# Altium footprint library PCB_GENERAL.PcbLib: 226 footprints (part 8 of 15)
Each footprint in its own frame and in the unit in brackets; x right, y up, seen from the top. Pads: shape width x height; smd on the part's side, far side on the other; paste and mask are expansions set on the pad; w line width, h text height; cw(c..) or ccw(c..) is an arc to the next point about the centre after c.
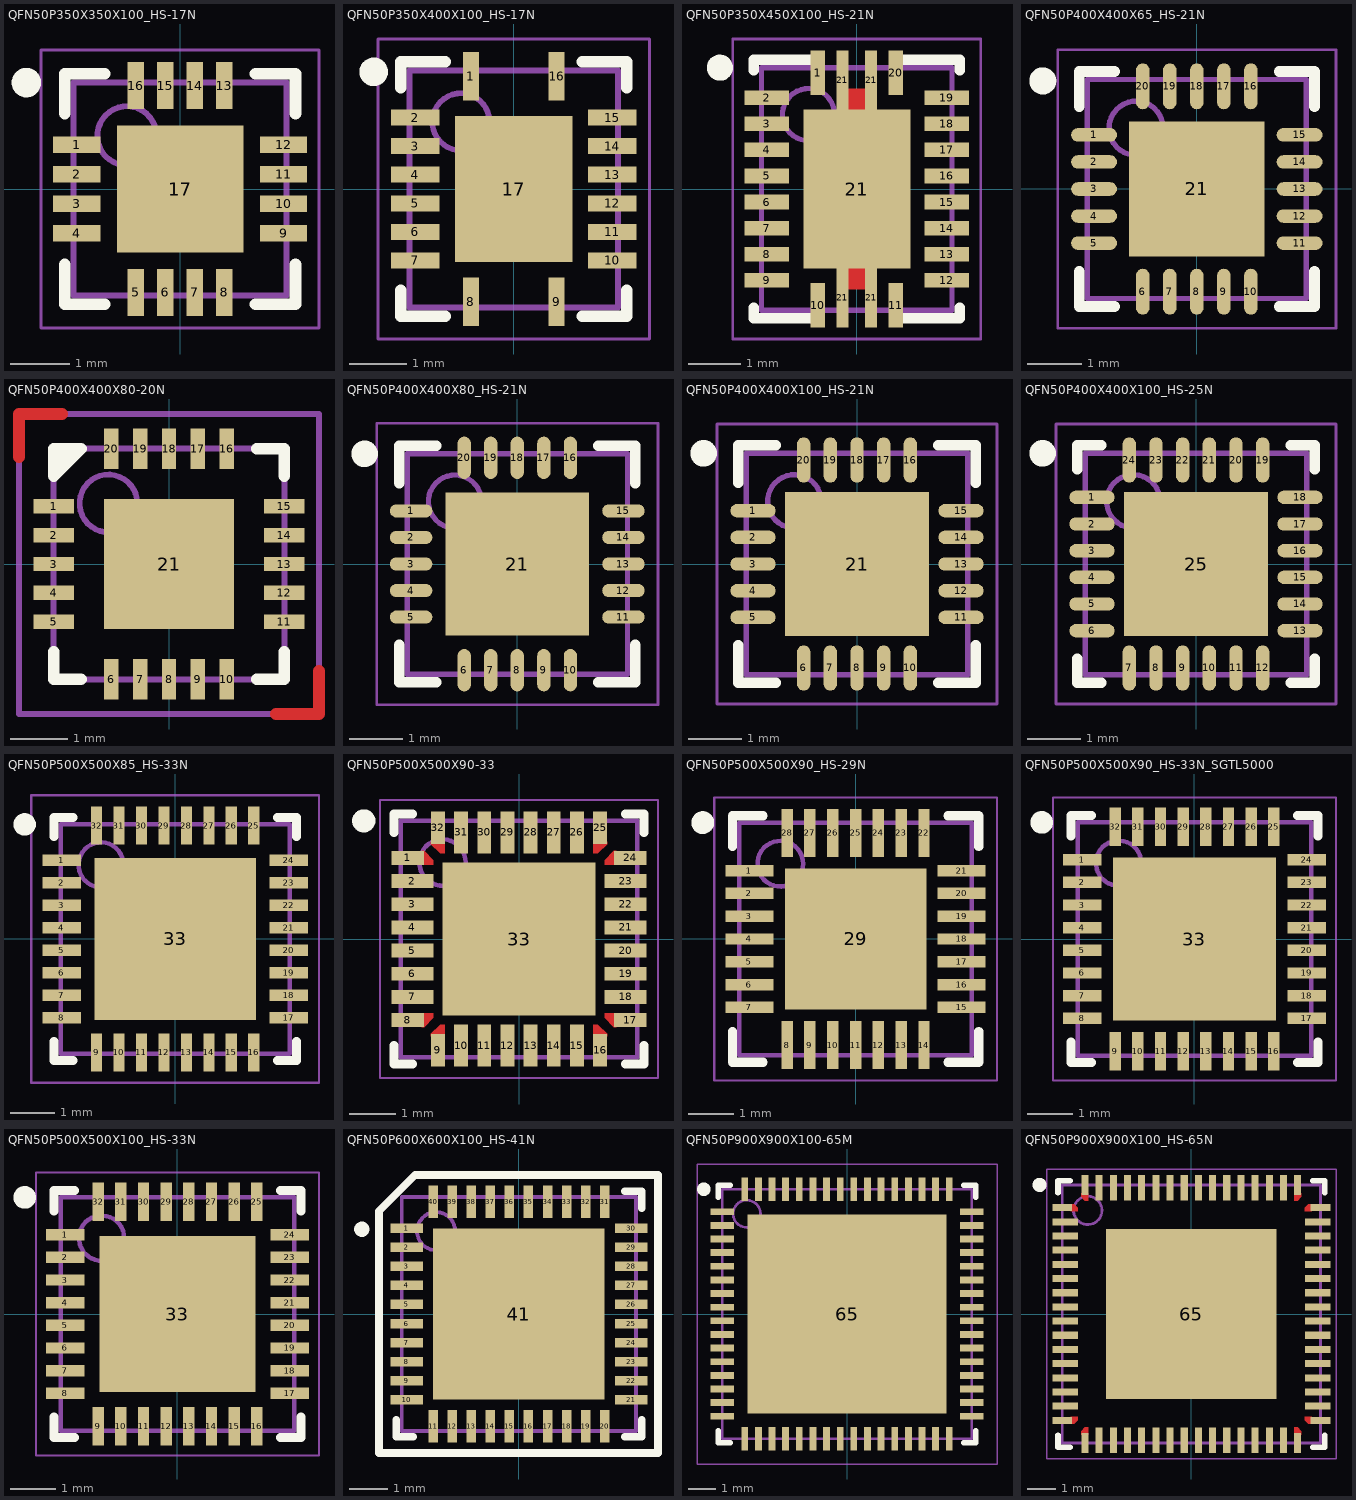
[diagram p7: the footprints below, top view; thin cyan lines are the x and y axes]

## QFN50P350X350X100_HS-17N [mm] "QFN, 16-Leads, Body 3,50x3,50mm, Pitch 0,50mm, Thermal Pad 2,14x2,14mm, IPC Medium Density"
height 1
pads (17):
  rect 0.8x0.28 smd: 1(-1.75,0.75) 2(-1.75,0.25) 3(-1.75,-0.25) 4(-1.75,-0.75) 9(1.75,-0.75) 10(1.75,-0.25) 11(1.75,0.25) 12(1.75,0.75)
  rect 0.28x0.8 smd: 5(-0.75,-1.75) 6(-0.25,-1.75) 7(0.25,-1.75) 8(0.75,-1.75) 13(0.75,1.75) 14(0.25,1.75) 15(-0.25,1.75) 16(-0.75,1.75)
  rect 2.14x2.14 smd: 17(0,0)
Top Overlay:
  circle w0.25: c-2.6,1.8 r0.125
  lines w0.2: -1.95,-1.275 -1.95,-1.95 -1.275,-1.95 ; -1.95,1.275 -1.95,1.95 -1.275,1.95 ; 1.275,-1.95 1.95,-1.95 1.95,-1.275 ; 1.275,1.95 1.95,1.95 1.95,1.275
Mechanical 11:
  text ".Designator" at -0.925,-0.325 h1
Mechanical 14:
  circle w0.1: c-0.9,0.9 r0.5
  lines w0.1: -1.8,-1.8 1.8,-1.8 1.8,1.8 -1.8,1.8 -1.8,-1.8
Mechanical 15:
  lines w0.05: -2.35,-2.35 2.35,-2.35 2.35,2.35 -2.35,2.35 -2.35,-2.35
  lines w0.1: -0.5,0 0.5,0 ; 0,-0.5 0,0.5
3D body "QFN50P350X350X100_HS-17N.step": height 1, standoff 0, extent -1.801,-1.801 1.801,1.801

## QFN50P350X400X100_HS-17N [mm] "QFN, 16-Leads, Body 3,50x4,00mm, Pitch 0,50mm, Thermal Pad 2,05x2,55mm, IPC Medium Density"
height 1
pads (17):
  rect 0.28x0.85 smd: 1(-0.75,1.975) 8(-0.75,-1.975) 9(0.75,-1.975) 16(0.75,1.975)
  rect 0.85x0.28 smd: 2(-1.725,1.25) 3(-1.725,0.75) 4(-1.725,0.25) 5(-1.725,-0.25) 6(-1.725,-0.75) 7(-1.725,-1.25) 10(1.725,-1.25) 11(1.725,-0.75) 12(1.725,-0.25) 13(1.725,0.25) 14(1.725,0.75) 15(1.725,1.25)
  rect 2.05x2.55 smd: 17(0,0)
Top Overlay:
  circle w0.25: c-2.45,2.05 r0.125
  lines w0.2: -1.975,-1.775 -1.975,-2.225 -1.2,-2.225 ; -1.975,1.775 -1.975,2.225 -1.2,2.225 ; 1.2,-2.225 1.975,-2.225 1.975,-1.775 ; 1.2,2.225 1.975,2.225 1.975,1.775
Mechanical 11:
  text ".Designator" at 0.525,-0.725 h1
Mechanical 14:
  circle w0.1: c-0.925,1.175 r0.5
  lines w0.1: -1.825,-2.075 -1.825,2.075 1.825,2.075 1.825,-2.075 -1.825,-2.075
Mechanical 15:
  lines w0.05: -2.375,-2.625 -2.375,2.625 2.375,2.625 2.375,-2.625 -2.375,-2.625
  lines w0.1: -0.5,0 0.5,0 ; 0,-0.5 0,0.5
3D body "QFN50P350X400X100_HS-17N.step": height 1, standoff 0, extent -1.826,-2.076 1.826,2.076

## QFN50P350X450X100_HS-21N [mm] "QFN, 20-Leads, Body 3,50x4,50mm, Pitch 0,50mm, Thermal Pad 2,05x3,05mm, IPC Medium Density"
height 1
pads (25):
  rect 0.28x0.85 smd: 1(-0.75,2.225) 10(-0.75,-2.225) 11(0.75,-2.225) 20(0.75,2.225)
  rect 0.85x0.28 smd: 2(-1.725,1.75) 3(-1.725,1.25) 4(-1.725,0.75) 5(-1.725,0.25) 6(-1.725,-0.25) 7(-1.725,-0.75) 8(-1.725,-1.25) 9(-1.725,-1.75) 12(1.725,-1.75) 13(1.725,-1.25) 14(1.725,-0.75) 15(1.725,-0.25) 16(1.725,0.25) 17(1.725,0.75) 18(1.725,1.25) 19(1.725,1.75)
  rect 0.23x1.125 smd: 21(-0.275,-2.088) 21(-0.275,2.088) 21(0.275,-2.088) 21(0.275,2.088)
  rect 2.05x3.05 smd: 21(0,0)
Top Layer:
  region: 0.275,-1.35 -0.275,-1.35 -0.275,-1.925 0.275,-1.925
  rectangle: -0.275,1.35 0.275,1.925
Top Overlay:
  circle w0.25: c-2.625,2.325 r0.125
  lines w0.2: -1.975,-2.275 -1.975,-2.475 -0.775,-2.475 ; -1.975,2.275 -1.975,2.475 -0.775,2.475 ; 0.775,-2.475 1.975,-2.475 1.975,-2.275 ; 0.775,2.475 1.975,2.475 1.975,2.275
Mechanical 11:
  text ".Designator" at -0.5,-0.3 h0.76
Mechanical 14:
  circle w0.1: c-0.925,1.425 r0.5
  lines w0.1: -1.825,-2.325 -1.825,2.325 1.825,2.325 1.825,-2.325 -1.825,-2.325
Mechanical 15:
  lines w0.05: -2.375,-2.875 -2.375,2.875 2.375,2.875 2.375,-2.875 -2.375,-2.875
  lines w0.1: -0.5,0 0.5,0 ; 0,-0.5 0,0.5
3D body "QFN50P350X450X100_HS-21N.step": height 1, standoff 0, extent -1.826,-2.326 1.826,2.326

## QFN50P400X400X65_HS-21N [mm] "QFN, 20-Leads, Body 4,00x4,00mm, Pitch 0,50mm, Thermal Pad 2,50x2,50mm, IPC Medium Density"
height 0.65
pads (21):
  oval 0.85x0.25 smd: 1(-1.9,1) 2(-1.9,0.5) 3(-1.9,0) 4(-1.9,-0.5) 5(-1.9,-1) 11(1.9,-1) 12(1.9,-0.5) 13(1.9,0) 14(1.9,0.5) 15(1.9,1)
  oval 0.25x0.85 smd: 6(-1,-1.9) 7(-0.5,-1.9) 8(0,-1.9) 9(0.5,-1.9) 10(1,-1.9) 16(1,1.9) 17(0.5,1.9) 18(0,1.9) 19(-0.5,1.9) 20(-1,1.9)
  rect 2.5x2.5 smd: 21(0,0)
Top Overlay:
  circle w0.25: c-2.85,2 r0.125
  lines w0.2: -2.175,-1.525 -2.175,-2.175 -1.525,-2.175 ; -2.175,1.525 -2.175,2.175 -1.525,2.175 ; 1.525,-2.175 2.175,-2.175 2.175,-1.525 ; 1.525,2.175 2.175,2.175 2.175,1.525
Mechanical 11:
  text ".Designator" at -2.675,3.125 h1
Mechanical 14:
  circle w0.1: c-1.125,1.125 r0.5
  lines w0.1: -2.025,-2.025 -2.025,2.025 2.025,2.025 2.025,-2.025 -2.025,-2.025
Mechanical 15:
  lines w0.05: -2.575,-2.575 -2.575,2.575 2.575,2.575 2.575,-2.575 -2.575,-2.575
  lines w0.1: -0.5,0 0.5,0 ; 0,-0.5 0,0.5
3D body "User Library-QFN20_4x4x0_8.STEP": height 0.78, standoff -0.02, extent -2.01,-2.01 2.01,2.01

## QFN50P400X400X80-20N [mm] "QFN, 20-Leads, Body 4,0x4,0mm (max), Pitch 0,50mm, IPC Medium Density"
height 0.8
pads (21):
  rect 0.7x0.25 smd: 1(-2,1) 2(-2,0.5) 3(-2,0) 4(-2,-0.5) 5(-2,-1) 11(2,-1) 12(2,-0.5) 13(2,0) 14(2,0.5) 15(2,1)
  rect 0.25x0.7 smd: 6(-1,-2) 7(-0.5,-2) 8(0,-2) 9(0.5,-2) 10(1,-2) 16(1,2) 17(0.5,2) 18(0,2) 19(-0.5,2) 20(-1,2)
  rect 2.25x2.25 smd paste-0.2: 21(0,0)
Top Layer:
  lines w0.203: -2.6,1.854 -2.6,2.6 -1.854,2.6 ; 1.854,-2.6 2.6,-2.6 2.6,-1.854
Top Overlay:
  lines w0.2: -2,-1.525 -2,-2 -1.525,-2 ; 1.525,-2 2,-2 2,-1.525 ; 1.525,2 2,2 2,1.525 ; -2,1.525 -1.525,2 -2,2 -2,1.525
  lines w0.203: -2,1.753 -1.771,1.981
Top Solder:
  lines w0.305: -2.6,1.854 -2.6,2.6 -1.854,2.6 ; 1.854,-2.6 2.6,-2.6 2.6,-1.854
Mechanical 13:
  circle w0.1: c-1.05,1.05 r0.5
  lines w0.1: -2,-2 -2,2 2,2 2,-2 -2,-2
Mechanical 15:
  lines w0.1: -0.5,0 0.5,0 ; 0,-0.5 0,0.5 ; -2.6,-2.6 -2.6,2.6 2.6,2.6 2.6,-2.6 -2.6,-2.6
3D body "User Library-QFN20_4x4x0_8.step": height 0.78, standoff -0.02, extent -2.01,-2.01 2.01,2.01

## QFN50P400X400X80_HS-21N [mm] "QFN, 20-Leads, Body 4x4mm, Pitch 0.5mm, Thermal Pad 4x4mm, IPC Medium Density"
height 0.8
pads (21):
  oval 0.8x0.25 smd: 1(-2,1) 2(-2,0.5) 3(-2,0) 4(-2,-0.5) 5(-2,-1) 11(2,-1) 12(2,-0.5) 13(2,0) 14(2,0.5) 15(2,1)
  oval 0.25x0.8 smd: 6(-1,-2) 7(-0.5,-2) 8(0,-2) 9(0.5,-2) 10(1,-2) 16(1,2) 17(0.5,2) 18(0,2) 19(-0.5,2) 20(-1,2)
  rect 2.7x2.7 smd: 21(0,0)
Top Overlay:
  circle w0.25: c-2.875,2.075 r0.125
  lines w0.2: -2.225,-1.525 -2.225,-2.225 -1.525,-2.225 ; -2.225,1.525 -2.225,2.225 -1.525,2.225 ; 1.525,-2.225 2.225,-2.225 2.225,-1.525 ; 1.525,2.225 2.225,2.225 2.225,1.525
Mechanical 11:
  text ".Designator" at -1.6,-0.2 h1
Mechanical 14:
  circle w0.1: c-1.175,1.175 r0.5
  lines w0.1: -2.075,-2.075 -2.075,2.075 2.075,2.075 2.075,-2.075 -2.075,-2.075
Mechanical 15:
  lines w0.05: -2.65,-2.65 -2.65,2.65 2.65,2.65 2.65,-2.65 -2.65,-2.65
  lines w0.1: -0.5,0 0.5,0 ; 0,-0.5 0,0.5
3D body: height 0.8, standoff 0, extent -2.075,-2.075 2.075,2.075

## QFN50P400X400X100_HS-21N [mm] "QFN, 20-Leads, Body 4,00x4,00mm, Pitch 0,50mm, Thermal Pad 2,70x2,70mm, IPC Medium Density"
height 1
pads (21):
  oval 0.85x0.25 smd: 1(-1.95,1) 2(-1.95,0.5) 3(-1.95,0) 4(-1.95,-0.5) 5(-1.95,-1) 11(1.95,-1) 12(1.95,-0.5) 13(1.95,0) 14(1.95,0.5) 15(1.95,1)
  oval 0.25x0.85 smd: 6(-1,-1.95) 7(-0.5,-1.95) 8(0,-1.95) 9(0.5,-1.95) 10(1,-1.95) 16(1,1.95) 17(0.5,1.95) 18(0,1.95) 19(-0.5,1.95) 20(-1,1.95)
  rect 2.7x2.7 smd paste-3: 21(0,0)
Top Overlay:
  circle w0.25: c-2.875,2.075 r0.125
  lines w0.2: -2.225,-1.525 -2.225,-2.225 -1.525,-2.225 ; -2.225,1.525 -2.225,2.225 -1.525,2.225 ; 1.525,-2.225 2.225,-2.225 2.225,-1.525 ; 1.525,2.225 2.225,2.225 2.225,1.525
Top Paste:
  rectangle: 0.15,0.15 1.25,1.25
  rectangle: 0.15,-1.25 1.25,-0.15
  rectangle: -1.25,-1.25 -0.15,-0.15
  rectangle: -1.25,0.15 -0.15,1.25
Mechanical 11:
  text ".Designator" at -1.2,-0.125 h0.3
Mechanical 14:
  circle w0.1: c-1.175,1.175 r0.5
  lines w0.1: -2.075,-2.075 -2.075,2.075 2.075,2.075 2.075,-2.075 -2.075,-2.075
Mechanical 15:
  lines w0.05: -2.625,-2.625 -2.625,2.625 2.625,2.625 2.625,-2.625 -2.625,-2.625
  lines w0.1: -0.5,0 0.5,0 ; 0,-0.5 0,0.5
3D body "SW3dPS-QFN4x4_20pins.STEP": height 0.8, standoff 0, extent -2.02,-2.02 2.02,2.02

## QFN50P400X400X100_HS-25N [mm] "QFN, 24-Leads, Body 4,00x4,00mm, Pitch 0,50mm, Thermal Pad 2,70x2,70mm, IPC Medium Density"
height 1
pads (25):
  oval 0.85x0.25 smd: 1(-1.95,1.25) 2(-1.95,0.75) 3(-1.95,0.25) 4(-1.95,-0.25) 5(-1.95,-0.75) 6(-1.95,-1.25) 13(1.95,-1.25) 14(1.95,-0.75) 15(1.95,-0.25) 16(1.95,0.25) 17(1.95,0.75) 18(1.95,1.25)
  oval 0.25x0.85 smd: 7(-1.25,-1.95) 8(-0.75,-1.95) 9(-0.25,-1.95) 10(0.25,-1.95) 11(0.75,-1.95) 12(1.25,-1.95) 19(1.25,1.95) 20(0.75,1.95) 21(0.25,1.95) 22(-0.25,1.95) 23(-0.75,1.95) 24(-1.25,1.95)
  rect 2.7x2.7 smd paste-3: 25(0,0)
Top Overlay:
  circle w0.25: c-2.875,2.075 r0.125
  lines w0.2: -2.225,-1.775 -2.225,-2.225 -1.775,-2.225 ; -2.225,1.775 -2.225,2.225 -1.775,2.225 ; 1.775,-2.225 2.225,-2.225 2.225,-1.775 ; 1.775,2.225 2.225,2.225 2.225,1.775
Top Paste:
  rectangle: -1.25,-1.25 -0.15,-0.15
  rectangle: 0.15,-1.25 1.25,-0.15
  rectangle: 0.15,0.15 1.25,1.25
  rectangle: -1.25,0.15 -0.15,1.25
Mechanical 11:
  text ".Designator" at -1.45,-0.25 h0.3
Mechanical 14:
  circle w0.1: c-1.175,1.175 r0.5
  lines w0.1: -2.075,-2.075 -2.075,2.075 2.075,2.075 2.075,-2.075 -2.075,-2.075
Mechanical 15:
  lines w0.05: -2.625,-2.625 -2.625,2.625 2.625,2.625 2.625,-2.625 -2.625,-2.625
  lines w0.1: -0.5,0 0.5,0 ; 0,-0.5 0,0.5
3D body "User Library-QFN24-0_5.STEP": height 1, standoff 0, extent -2,-2 2,2

## QFN50P500X500X85_HS-33N [mm] "QFN, 32-Leads, Body 5,00x5,00mm, Pitch 0,50mm, Thermal Pad 3,60x3,60mm, IPC Medium Density"
height 0.85
pads (33):
  rect 0.85x0.25 smd: 1(-2.525,1.75) 2(-2.525,1.25) 3(-2.525,0.75) 4(-2.525,0.25) 5(-2.525,-0.25) 6(-2.525,-0.75) 7(-2.525,-1.25) 8(-2.525,-1.75) 17(2.525,-1.75) 18(2.525,-1.25) 19(2.525,-0.75) 20(2.525,-0.25) 21(2.525,0.25) 22(2.525,0.75) 23(2.525,1.25) 24(2.525,1.75)
  rect 0.25x0.85 smd: 9(-1.75,-2.525) 10(-1.25,-2.525) 11(-0.75,-2.525) 12(-0.25,-2.525) 13(0.25,-2.525) 14(0.75,-2.525) 15(1.25,-2.525) 16(1.75,-2.525) 25(1.75,2.525) 26(1.25,2.525) 27(0.75,2.525) 28(0.25,2.525) 29(-0.25,2.525) 30(-0.75,2.525) 31(-1.25,2.525) 32(-1.75,2.525)
  rect 3.6x3.6 smd: 33(0,0)
Top Overlay:
  circle w0.25: c-3.35,2.55 r0.125
  lines w0.2: -2.7,-2.275 -2.7,-2.7 -2.275,-2.7 ; -2.7,2.275 -2.7,2.7 -2.275,2.7 ; 2.275,-2.7 2.7,-2.7 2.7,-2.275 ; 2.275,2.7 2.7,2.7 2.7,2.275
Mechanical 11:
  text ".Designator" at -1.775,-0.29 h1
Mechanical 14:
  circle w0.1: c-1.65,1.65 r0.5
  lines w0.1: -2.55,-2.55 -2.55,2.55 2.55,2.55 2.55,-2.55 -2.55,-2.55
Mechanical 15:
  lines w0.05: -3.2,-3.2 -3.2,3.2 3.2,3.2 3.2,-3.2 -3.2,-3.2
  lines w0.1: -0.5,0 0.5,0 ; 0,-0.5 0,0.5
3D body "QFN50P500X500X85_HS-33Nnew.step": height 0.85, standoff 0, extent -2.551,-2.551 2.551,2.551

## QFN50P500X500X90-33 [mm] "QFN, 32-Leads, Body 5x5mm, Pitch 0.5mm, Thermal Pad 3.3x3.3mm, FTDI Recommended"
height 1
pads (33):
  rect 0.7x0.3 smd paste-0.15 mask-0.15: 1(-2.4,1.75) 8(-2.4,-1.75) 17(2.4,-1.75) 24(2.4,1.75)
  rect 0.9x0.3 smd paste-0.16 mask+0.05: 2(-2.3,1.25) 3(-2.3,0.75) 4(-2.3,0.25) 5(-2.3,-0.25) 6(-2.3,-0.75) 7(-2.3,-1.25) 18(2.3,-1.25) 19(2.3,-0.75) 20(2.3,-0.25) 21(2.3,0.25) 22(2.3,0.75) 23(2.3,1.25)
  rect 0.3x0.7 smd paste-0.15 mask-0.15: 9(-1.75,-2.4) 16(1.75,-2.4) 25(1.75,2.4) 32(-1.75,2.4)
  rect 0.3x0.9 smd paste-0.16 mask+0.05: 10(-1.25,-2.3) 11(-0.75,-2.3) 12(-0.25,-2.3) 13(0.25,-2.3) 14(0.75,-2.3) 15(1.25,-2.3) 26(1.25,2.3) 27(0.75,2.3) 28(0.25,2.3) 29(-0.25,2.3) 30(-0.75,2.3) 31(-1.25,2.3)
  rect 3.3x3.3 smd paste-1.65 mask+0.06: 33(0,0)
Top Layer:
  region: -2.1,-1.6 -1.85,-1.6 -1.85,-1.7 -2.05,-1.9 -2.1,-1.9
  region: 2.1,-1.6 1.85,-1.6 1.85,-1.7 2.05,-1.9 2.1,-1.9
  region: 2.1,1.6 1.85,1.6 1.85,1.7 2.05,1.9 2.1,1.9
  region: -2.1,1.6 -1.85,1.6 -1.85,1.7 -2.05,1.9 -2.1,1.9
  region: -1.6,-2.1 -1.6,-1.85 -1.7,-1.85 -1.9,-2.05 -1.9,-2.1
  region: 1.6,2.1 1.6,1.85 1.7,1.85 1.9,2.05 1.9,2.1
  region: -1.6,2.1 -1.6,1.85 -1.7,1.85 -1.9,2.05 -1.9,2.1
  region: 1.6,-1.85 1.6,-2.1 1.9,-2.1 1.9,-2.05 1.7,-1.85
Top Overlay:
  circle w0.25: c-3.35,2.55 r0.125
  lines w0.2: -2.7,-2.3 -2.7,-2.7 -2.3,-2.7 ; -2.7,2.3 -2.7,2.7 -2.3,2.7 ; 2.3,-2.7 2.7,-2.7 2.7,-2.3 ; 2.3,2.7 2.7,2.7 2.7,2.3
Top Paste:
  rectangle: 1.85,1.1 2.75,1.4
  rectangle: 1.85,0.6 2.75,0.9
  rectangle: 1.85,0.1 2.75,0.4
  rectangle: 1.85,-0.4 2.75,-0.1
  rectangle: 1.85,-0.9 2.75,-0.6
  rectangle: 1.85,-1.4 2.75,-1.1
  region: -1.85,-1.1 -2.75,-1.1 -2.75,-1.4 -1.85,-1.4
  region: -1.85,-0.6 -2.75,-0.6 -2.75,-0.9 -1.85,-0.9
  region: -1.85,-0.1 -2.75,-0.1 -2.75,-0.4 -1.85,-0.4
  region: -1.85,0.4 -2.75,0.4 -2.75,0.1 -1.85,0.1
  region: -1.85,0.9 -2.75,0.9 -2.75,0.6 -1.85,0.6
  region: -1.85,1.4 -2.75,1.4 -2.75,1.1 -1.85,1.1
  region: 1.1,-1.85 1.1,-2.75 1.4,-2.75 1.4,-1.85
  region: 0.6,-1.85 0.6,-2.75 0.9,-2.75 0.9,-1.85
  region: 0.1,-1.85 0.1,-2.75 0.4,-2.75 0.4,-1.85
  region: -0.4,-1.85 -0.4,-2.75 -0.1,-2.75 -0.1,-1.85
  region: -0.9,-1.85 -0.9,-2.75 -0.6,-2.75 -0.6,-1.85
  region: -1.4,-1.85 -1.4,-2.75 -1.1,-2.75 -1.1,-1.85
  region: 1.4,1.85 1.4,2.75 1.1,2.75 1.1,1.85
  region: 0.9,1.85 0.9,2.75 0.6,2.75 0.6,1.85
  region: 0.4,1.85 0.4,2.75 0.1,2.75 0.1,1.85
  region: -0.1,1.85 -0.1,2.75 -0.4,2.75 -0.4,1.85
  region: -0.6,1.85 -0.6,2.75 -0.9,2.75 -0.9,1.85
  region: -1.1,1.85 -1.1,2.75 -1.4,2.75 -1.4,1.85
  rectangle: -0.3,0.1 0.3,0.4
  rectangle: -1.3,0.1 -0.7,0.4
  rectangle: 0.7,0.1 1.3,0.4
  rectangle: -0.3,-0.4 0.3,-0.1
  rectangle: 0.7,-0.4 1.3,-0.1
  rectangle: -1.3,-0.4 -0.7,-0.1
  rectangle: -1.3,-1.4 -0.7,-1.1
  rectangle: 0.7,-1.4 1.3,-1.1
  rectangle: -0.3,-1.4 0.3,-1.1
  rectangle: 0.7,-0.9 1.3,-0.6
  rectangle: -1.3,-0.9 -0.7,-0.6
  rectangle: -0.3,-0.9 0.3,-0.6
  rectangle: -1.3,0.6 -0.7,0.9
  rectangle: 0.7,0.6 1.3,0.9
  rectangle: -0.3,0.6 0.3,0.9
  rectangle: 0.7,1.1 1.3,1.4
  rectangle: -1.3,1.1 -0.7,1.4
  rectangle: -0.3,1.1 0.3,1.4
  region: 1.6,-1.85 1.6,-2.75 1.9,-2.75 1.9,-2.05 1.7,-1.85
  region: 1.85,1.6 2.75,1.601 2.75,1.898 2.05,1.9 1.85,1.7
  region: 1.85,-1.6 2.75,-1.6 2.75,-1.9 2.05,-1.9 1.85,-1.7
  region: 1.6,1.85 1.6,2.75 1.9,2.75 1.9,2.05 1.7,1.85
  region: -1.85,1.6 -2.75,1.6 -2.75,1.9 -2.05,1.9 -1.85,1.7
  region: -1.85,-1.6 -2.75,-1.6 -2.75,-1.9 -2.05,-1.9 -1.85,-1.7
  region: -1.6,-1.85 -1.6,-2.75 -1.9,-2.75 -1.9,-2.05 -1.7,-1.85
  region: -1.6,1.85 -1.6,2.75 -1.9,2.75 -1.9,2.05 -1.7,1.85
Top Solder:
  region: 1.96,-2.025 1.96,-2.8 1.54,-2.8 1.54,-1.79 1.725,-1.79
  region: 2.025,1.96 2.8,1.96 2.8,1.54 1.79,1.54 1.79,1.725
  region: 2.025,-1.96 2.8,-1.96 2.8,-1.54 1.79,-1.54 1.79,-1.725
  region: 1.96,2.025 1.96,2.8 1.54,2.8 1.54,1.79 1.725,1.79
  region: -2.025,1.96 -2.8,1.96 -2.8,1.54 -1.79,1.54 -1.79,1.725
  region: -2.025,-1.96 -2.8,-1.96 -2.8,-1.54 -1.79,-1.54 -1.79,-1.725
  region: -1.96,-2.025 -1.96,-2.8 -1.54,-2.8 -1.54,-1.8 -1.735,-1.8
  region: -1.96,2.025 -1.96,2.8 -1.54,2.8 -1.54,1.79 -1.725,1.79
Mechanical 11:
  text ".Designator" at -1.3,-0.4 h1
Mechanical 14:
  circle w0.1: c-1.65,1.65 r0.5
  lines w0.1: -2.55,-2.55 2.55,-2.55 2.55,2.55 -2.55,2.55 -2.55,-2.55
Mechanical 15:
  lines w0.05: -3,-3 3,-3 3,3 -3,3 -3,-3
  lines w0.1: -0.5,0 0.5,0 ; 0,-0.5 0,0.5
3D body: height 1, standoff 0, extent -2.55,-2.55 2.55,2.55

## QFN50P500X500X90_HS-29N [mm] "QFN, 28-Leads, Body 5,00x5,00mm, Pitch 0,50mm, Thermal Pad 3,10x3,10mm, IPC Medium Density"
height 0.9
pads (29):
  rect 1.05x0.25 smd: 1(-2.325,1.5) 2(-2.325,1) 3(-2.325,0.5) 4(-2.325,0) 5(-2.325,-0.5) 6(-2.325,-1) 7(-2.325,-1.5) 15(2.325,-1.5) 16(2.325,-1) 17(2.325,-0.5) 18(2.325,0) 19(2.325,0.5) 20(2.325,1) 21(2.325,1.5)
  rect 0.25x1.05 smd: 8(-1.5,-2.325) 9(-1,-2.325) 10(-0.5,-2.325) 11(0,-2.325) 12(0.5,-2.325) 13(1,-2.325) 14(1.5,-2.325) 22(1.5,2.325) 23(1,2.325) 24(0.5,2.325) 25(0,2.325) 26(-0.5,2.325) 27(-1,2.325) 28(-1.5,2.325)
  rect 3.1x3.1 smd: 29(0,0)
Top Overlay:
  circle w0.25: c-3.35,2.55 r0.125
  lines w0.2: -2.7,-2.025 -2.7,-2.7 -2.025,-2.7 ; -2.7,2.025 -2.7,2.7 -2.025,2.7 ; 2.025,-2.7 2.7,-2.7 2.7,-2.025 ; 2.025,2.7 2.7,2.7 2.7,2.025
Mechanical 11:
  text ".Designator" at -2.85,3.525 h1
Mechanical 14:
  circle w0.1: c-1.65,1.65 r0.5
  lines w0.1: -2.55,-2.55 -2.55,2.55 2.55,2.55 2.55,-2.55 -2.55,-2.55
Mechanical 15:
  lines w0.05: -3.1,-3.1 -3.1,3.1 3.1,3.1 3.1,-3.1 -3.1,-3.1
  lines w0.1: -0.5,0 0.5,0 ; 0,-0.5 0,0.5
3D body "User Library-QFN28-0_5.STEP": height 1, standoff 0, extent -2.5,-2.5 2.5,2.5

## QFN50P500X500X90_HS-33N_SGTL5000 [mm] "QFN, 32-Leads, Body 5,00x5,00mm, Pitch 0,50mm, Thermal Pad 3,40x3,40mm, IPC Medium Density"
height 0.9
pads (33):
  rect 0.85x0.25 smd: 1(-2.475,1.75) 2(-2.475,1.25) 3(-2.475,0.75) 4(-2.475,0.25) 5(-2.475,-0.25) 6(-2.475,-0.75) 7(-2.475,-1.25) 8(-2.475,-1.75) 17(2.475,-1.75) 18(2.475,-1.25) 19(2.475,-0.75) 20(2.475,-0.25) 21(2.475,0.25) 22(2.475,0.75) 23(2.475,1.25) 24(2.475,1.75)
  rect 0.25x0.85 smd: 9(-1.75,-2.475) 10(-1.25,-2.475) 11(-0.75,-2.475) 12(-0.25,-2.475) 13(0.25,-2.475) 14(0.75,-2.475) 15(1.25,-2.475) 16(1.75,-2.475) 25(1.75,2.475) 26(1.25,2.475) 27(0.75,2.475) 28(0.25,2.475) 29(-0.25,2.475) 30(-0.75,2.475) 31(-1.25,2.475) 32(-1.75,2.475)
  rect 3.6x3.6 smd: 33(0,0)
Top Overlay:
  circle w0.25: c-3.375,2.575 r0.125
  lines w0.2: -2.725,-2.275 -2.725,-2.725 -2.275,-2.725 ; -2.725,2.275 -2.725,2.725 -2.275,2.725 ; 2.275,-2.725 2.725,-2.725 2.725,-2.275 ; 2.275,2.725 2.725,2.725 2.725,2.275
Mechanical 11:
  text ".Designator" at -0.55,-0.45 h1
Mechanical 14:
  circle w0.1: c-1.675,1.675 r0.5
  lines w0.1: -2.575,-2.575 -2.575,2.575 2.575,2.575 2.575,-2.575 -2.575,-2.575
Mechanical 15:
  lines w0.05: -3.125,-3.125 -3.125,3.125 3.125,3.125 3.125,-3.125 -3.125,-3.125
  lines w0.1: -0.5,0 0.5,0 ; 0,-0.5 0,0.5
3D body "QFN50P500X500X90_HS-33N.step": height 0.9, standoff 0, extent -2.576,-2.576 2.576,2.576

## QFN50P500X500X100_HS-33N [mm] "QFN, 32-Leads, Body 5,00x5,00mm, Pitch 0,50mm, Thermal Pad 3,45x3,45mm, IPC Medium Density"
height 1
pads (33):
  rect 0.85x0.25 smd: 1(-2.475,1.75) 2(-2.475,1.25) 3(-2.475,0.75) 4(-2.475,0.25) 5(-2.475,-0.25) 6(-2.475,-0.75) 7(-2.475,-1.25) 8(-2.475,-1.75) 17(2.475,-1.75) 18(2.475,-1.25) 19(2.475,-0.75) 20(2.475,-0.25) 21(2.475,0.25) 22(2.475,0.75) 23(2.475,1.25) 24(2.475,1.75)
  rect 0.25x0.85 smd: 9(-1.75,-2.475) 10(-1.25,-2.475) 11(-0.75,-2.475) 12(-0.25,-2.475) 13(0.25,-2.475) 14(0.75,-2.475) 15(1.25,-2.475) 16(1.75,-2.475) 25(1.75,2.475) 26(1.25,2.475) 27(0.75,2.475) 28(0.25,2.475) 29(-0.25,2.475) 30(-0.75,2.475) 31(-1.25,2.475) 32(-1.75,2.475)
  rect 3.45x3.45 smd: 33(0,0)
Top Overlay:
  circle w0.25: c-3.375,2.575 r0.125
  lines w0.2: -2.725,-2.275 -2.725,-2.725 -2.275,-2.725 ; -2.725,2.275 -2.725,2.725 -2.275,2.725 ; 2.275,-2.725 2.725,-2.725 2.725,-2.275 ; 2.275,2.725 2.725,2.725 2.725,2.275
Mechanical 11:
  text ".Designator" at -3.05,-0.325 h1
Mechanical 14:
  circle w0.1: c-1.675,1.675 r0.5
  lines w0.1: -2.575,-2.575 2.575,-2.575 2.575,2.575 -2.575,2.575 -2.575,-2.575
Mechanical 15:
  lines w0.05: -3.125,-3.125 3.125,-3.125 3.125,3.125 -3.125,3.125 -3.125,-3.125
  lines w0.1: -0.5,0 0.5,0 ; 0,-0.5 0,0.5
3D body "QFN50P500X500X100_HS-33N.step": height 1, standoff 0, extent -2.576,-2.576 2.576,2.576

## QFN50P600X600X100_HS-41N [mm] "QFN, 40-Leads, Body 6,00x6,00mm, Pitch 0,50mm, Thermal Pad 4,50x4,50mm, IPC Medium Density"
height 1
pads (41):
  rect 0.85x0.25 smd: 1(-2.95,2.25) 2(-2.95,1.75) 3(-2.95,1.25) 4(-2.95,0.75) 5(-2.95,0.25) 6(-2.95,-0.25) 7(-2.95,-0.75) 8(-2.95,-1.25) 9(-2.95,-1.75) 10(-2.95,-2.25) 21(2.95,-2.25) 22(2.95,-1.75) 23(2.95,-1.25) 24(2.95,-0.75) 25(2.95,-0.25) 26(2.95,0.25) 27(2.95,0.75) 28(2.95,1.25) 29(2.95,1.75) 30(2.95,2.25)
  rect 0.25x0.85 smd: 11(-2.25,-2.95) 12(-1.75,-2.95) 13(-1.25,-2.95) 14(-0.75,-2.95) 15(-0.25,-2.95) 16(0.25,-2.95) 17(0.75,-2.95) 18(1.25,-2.95) 19(1.75,-2.95) 20(2.25,-2.95) 31(2.25,2.95) 32(1.75,2.95) 33(1.25,2.95) 34(0.75,2.95) 35(0.25,2.95) 36(-0.25,2.95) 37(-0.75,2.95) 38(-1.25,2.95) 39(-1.75,2.95) 40(-2.25,2.95)
  rect 4.5x4.5 smd: 41(0,0)
Top Overlay:
  circle w0.2: c-4.125,2.225 r0.1
  lines w0.2: -3.225,-2.775 -3.225,-3.225 -2.775,-3.225 ; 2.775,-3.225 3.225,-3.225 3.225,-2.775 ; 2.775,3.225 3.225,3.225 3.225,2.775 ; -3.675,-3.65 -3.675,2.7 -2.725,3.65 3.65,3.65 3.65,-3.65 -3.675,-3.65
Mechanical 11:
  text ".Designator" at -4.45,4.275 h1
Mechanical 14:
  circle w0.1: c-2.175,2.175 r0.5
  lines w0.1: -3.075,-3.075 -3.075,3.075 3.075,3.075 3.075,-3.075 -3.075,-3.075
Mechanical 15:
  lines w0.05: -0.5,0 0.5,0 ; 0,-0.5 0,0.5 ; -3.6,-3.575 -3.6,2.775 -2.775,3.6 3.575,3.6 3.575,-3.575 -3.6,-3.575
3D body "User Library-QFN-40.STEP": height 1.06, standoff 0.01, extent -3.075,-3.075 3.075,3.075

## QFN50P900X900X100-65M [mm] "QFN, 64-Leads, Body 9x9mm, Pitch 0.5mm, Thermal Pad 7.3x7.3mm, IPC Low Density"
height 1
pads (65):
  rect 0.85x0.25 smd: 1(-4.575,3.75) 2(-4.575,3.25) 3(-4.575,2.75) 4(-4.575,2.25) 5(-4.575,1.75) 6(-4.575,1.25) 7(-4.575,0.75) 8(-4.575,0.25) 9(-4.575,-0.25) 10(-4.575,-0.75) 11(-4.575,-1.25) 12(-4.575,-1.75) 13(-4.575,-2.25) 14(-4.575,-2.75) 15(-4.575,-3.25) 16(-4.575,-3.75) 33(4.575,-3.75) 34(4.575,-3.25) 35(4.575,-2.75) 36(4.575,-2.25) 37(4.575,-1.75) 38(4.575,-1.25) 39(4.575,-0.75) 40(4.575,-0.25) 41(4.575,0.25) 42(4.575,0.75) 43(4.575,1.25) 44(4.575,1.75) 45(4.575,2.25) 46(4.575,2.75) 47(4.575,3.25) 48(4.575,3.75)
  rect 0.25x0.85 smd: 17(-3.75,-4.575) 18(-3.25,-4.575) 19(-2.75,-4.575) 20(-2.25,-4.575) 21(-1.75,-4.575) 22(-1.25,-4.575) 23(-0.75,-4.575) 24(-0.25,-4.575) 25(0.25,-4.575) 26(0.75,-4.575) 27(1.25,-4.575) 28(1.75,-4.575) 29(2.25,-4.575) 30(2.75,-4.575) 31(3.25,-4.575) 32(3.75,-4.575) 49(3.75,4.575) 50(3.25,4.575) 51(2.75,4.575) 52(2.25,4.575) 53(1.75,4.575) 54(1.25,4.575) 55(0.75,4.575) 56(0.25,4.575) 57(-0.25,4.575) 58(-0.75,4.575) 59(-1.25,4.575) 60(-1.75,4.575) 61(-2.25,4.575) 62(-2.75,4.575) 63(-3.25,4.575) 64(-3.75,4.575)
  rect 7.3x7.3 smd: 65(0,0)
Top Overlay:
  circle w0.25: c-5.25,4.575 r0.125
  lines w0.2: -4.725,-4.275 -4.725,-4.725 -4.275,-4.725 ; -4.725,4.275 -4.725,4.725 -4.275,4.725 ; 4.275,-4.725 4.725,-4.725 4.725,-4.275 ; 4.275,4.725 4.725,4.725 4.725,4.275
Mechanical 11:
  text ".Designator" at -4.625,6.225 h1
Mechanical 14:
  circle w0.1: c-3.675,3.675 r0.5
  lines w0.1: -4.575,-4.575 -4.575,4.575 4.575,4.575 4.575,-4.575 -4.575,-4.575
Mechanical 15:
  lines w0.05: -5.5,-5.5 -5.5,5.5 5.5,5.5 5.5,-5.5 -5.5,-5.5
  lines w0.1: -0.5,0 0.5,0 ; 0,-0.5 0,0.5
3D body "User Library-QFN64-2.STEP": height 0.9, standoff 0, extent -4.52,-4.52 4.52,4.52

## QFN50P900X900X100_HS-65N [mm] "QFN, 64-Leads, Body 9,00x9,00mm, Pitch 0,50mm, Thermal Pad 6,00x6,00mm, IPC Medium Density"
height 1
pads (65):
  rect 0.7x0.25 smd: 1(-4.55,3.75) 16(-4.55,-3.75) 33(4.55,-3.75) 48(4.55,3.75)
  rect 0.9x0.25 smd: 2(-4.45,3.25) 3(-4.45,2.75) 4(-4.45,2.25) 5(-4.45,1.75) 6(-4.45,1.25) 7(-4.45,0.75) 8(-4.45,0.25) 9(-4.45,-0.25) 10(-4.45,-0.75) 11(-4.45,-1.25) 12(-4.45,-1.75) 13(-4.45,-2.25) 14(-4.45,-2.75) 15(-4.45,-3.25) 34(4.45,-3.25) 35(4.45,-2.75) 36(4.45,-2.25) 37(4.45,-1.75) 38(4.45,-1.25) 39(4.45,-0.75) 40(4.45,-0.25) 41(4.45,0.25) 42(4.45,0.75) 43(4.45,1.25) 44(4.45,1.75) 45(4.45,2.25) 46(4.45,2.75) 47(4.45,3.25)
  rect 0.25x0.7 smd: 17(-3.75,-4.55) 32(3.75,-4.55) 49(3.75,4.55) 64(-3.75,4.55)
  rect 0.25x0.9 smd: 18(-3.25,-4.45) 19(-2.75,-4.45) 20(-2.25,-4.45) 21(-1.75,-4.45) 22(-1.25,-4.45) 23(-0.75,-4.45) 24(-0.25,-4.45) 25(0.25,-4.45) 26(0.75,-4.45) 27(1.25,-4.45) 28(1.75,-4.45) 29(2.25,-4.45) 30(2.75,-4.45) 31(3.25,-4.45) 50(3.25,4.45) 51(2.75,4.45) 52(2.25,4.45) 53(1.75,4.45) 54(1.25,4.45) 55(0.75,4.45) 56(0.25,4.45) 57(-0.25,4.45) 58(-0.75,4.45) 59(-1.25,4.45) 60(-1.75,4.45) 61(-2.25,4.45) 62(-2.75,4.45) 63(-3.25,4.45)
  rect 6x6 smd: 65(0,0)
Top Layer:
  region: -4.25,3.625 -4,3.625 -4,3.75 -4.125,3.875 -4.25,3.875
  region: -3.625,4.25 -3.625,4 -3.75,4 -3.875,4.125 -3.875,4.25
  region: -4.25,-3.625 -4,-3.625 -4,-3.75 -4.125,-3.875 -4.25,-3.875
  region: -3.625,-4.25 -3.625,-4 -3.75,-4 -3.875,-4.125 -3.875,-4.25
  region: 3.625,-4.25 3.625,-4 3.75,-4 3.875,-4.125 3.875,-4.25
  region: 4.25,-3.625 4,-3.625 4,-3.75 4.125,-3.875 4.25,-3.875
  region: 4.25,3.625 4,3.625 4,3.75 4.125,3.875 4.25,3.875
  region: 3.625,4.25 3.625,4 3.75,4 3.875,4.125 3.875,4.25
Top Overlay:
  circle w0.25: c-5.35,4.55 r0.125
  lines w0.2: -4.7,-4.275 -4.7,-4.7 -4.275,-4.7 ; -4.7,4.275 -4.7,4.7 -4.275,4.7 ; 4.275,-4.7 4.7,-4.7 4.7,-4.275 ; 4.275,4.7 4.7,4.7 4.7,4.275
Top Solder:
  region: -4.15,3.525 -3.9,3.525 -3.9,3.775 -4.1,3.975 -4.15,3.975
  region: -3.525,4.15 -3.525,3.9 -3.775,3.9 -3.975,4.1 -3.975,4.15
  region: -4.15,-3.525 -3.9,-3.525 -3.9,-3.775 -4.1,-3.975 -4.15,-3.975
  region: -3.525,-4.15 -3.525,-3.9 -3.775,-3.9 -3.975,-4.1 -3.975,-4.15
  region: 3.525,-4.15 3.525,-3.9 3.775,-3.9 3.975,-4.1 3.975,-4.15
  region: 4.15,-3.525 3.9,-3.525 3.9,-3.775 4.1,-3.975 4.15,-3.975
  region: 4.15,3.525 3.9,3.525 3.9,3.775 4.1,3.975 4.15,3.975
  region: 3.525,4.15 3.525,3.9 3.775,3.9 3.975,4.1 3.975,4.15
Mechanical 11:
  text ".Designator" at -2.725,-0.675 h1
Mechanical 14:
  circle w0.1: c-3.65,3.65 r0.5
  lines w0.1: -4.55,-4.55 4.55,-4.55 4.55,4.55 -4.55,4.55 -4.55,-4.55
Mechanical 15:
  lines w0.05: -5.1,-5.1 5.1,-5.1 5.1,5.1 -5.1,5.1 -5.1,-5.1
  lines w0.1: -0.5,0 0.5,0 ; 0,-0.5 0,0.5
3D body "QFN50P900X900X100_HS-65N.step": height 1, standoff 0, extent -4.551,-4.551 4.551,4.551